# Altium footprint library KNR_Kurs.PcbLib: 250 footprints (part 12 of 16)
Each footprint in its own frame and in the unit in brackets; x right, y up, seen from the top. Pads: shape width x height; smd on the part's side, far side on the other; paste and mask are expansions set on the pad; w line width, h text height; cw(c..) or ccw(c..) is an arc to the next point about the centre after c.
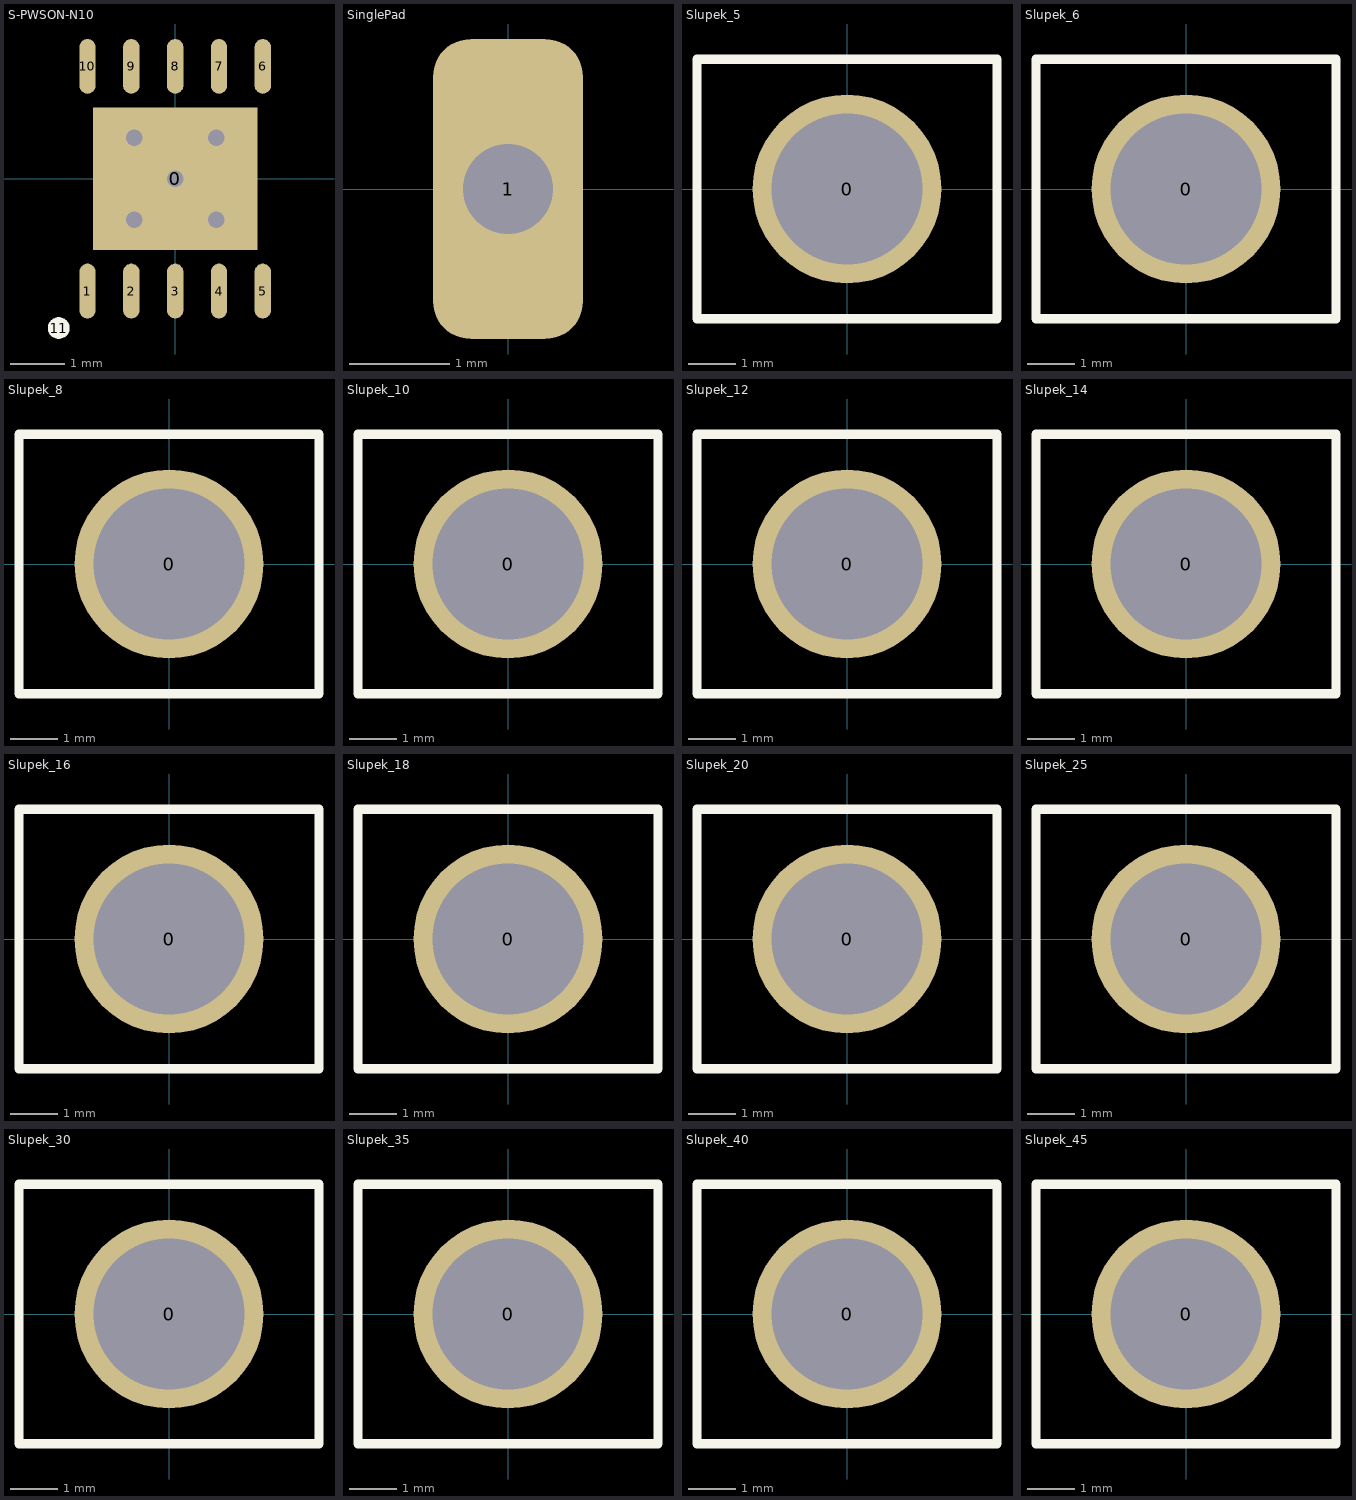
[diagram p11: the footprints below, top view; thin cyan lines are the x and y axes]

## S-PWSON-N10 [mm]
pads (12):
  rect 3x2.6 smd mask+0.07: 0(0,0)
  oval 0.3x1 smd mask+0.07: 1(-1.6,-2.05) 2(-0.8,-2.05) 3(0,-2.05) 4(0.8,-2.05) 5(1.6,-2.05) 6(1.6,2.05) 7(0.8,2.05) 8(0,2.05) 9(-0.8,2.05) 10(-1.6,2.05)
  round 0.4 on Top Overlay mask+0.07: 11(-2.125,-2.725)
via 0,0 diameter 0.6 hole 0.3
via 0.75,0.75 diameter 0.6 hole 0.3
via -0.75,0.75 diameter 0.6 hole 0.3
via -0.75,-0.75 diameter 0.6 hole 0.3
via 0.75,-0.75 diameter 0.6 hole 0.3
3D body "User Library-WSON-10-1.step": height 0.8, standoff 0, extent -2,-2 2,2

## SinglePad [mm]
pads (1):
  rrect50% 1.5x3 hole 0.9 mask+0.07: 1(0,0)

## Slupek_5 [mm] "M3, 5.5mm width"
pads (1):
  round 4 hole 3.2: 0(0,0)
Top Overlay:
  lines w0.2: -3.175,-2.75 3.175,-2.75 3.175,2.75 -3.175,2.75 -3.175,-2.75
3D body "Slupek_5.stp": height 5, standoff 0, extent -3.175,-2.75 3.175,2.75

## Slupek_6 [mm] "M3, 5.5mm width"
pads (1):
  round 4 hole 3.2: 0(0,0)
Top Overlay:
  lines w0.2: -3.175,-2.75 -3.175,2.75 3.175,2.75 3.175,-2.75 -3.175,-2.75
3D body "Slupek_6.stp": height 6, standoff 0, extent -3.175,-2.75 3.175,2.75

## Slupek_8 [mm] "M3, 5.5mm width"
pads (1):
  round 4 hole 3.2: 0(0,0)
Top Overlay:
  lines w0.2: -3.175,-2.75 3.175,-2.75 3.175,2.75 -3.175,2.75 -3.175,-2.75
3D body "Slupek_8.stp": height 8, standoff 0, extent -3.175,-2.75 3.175,2.75

## Slupek_10 [mm] "M3, 5.5mm width"
pads (1):
  round 4 hole 3.2: 0(0,0)
Top Overlay:
  lines w0.2: -3.175,-2.75 3.175,-2.75 3.175,2.75 -3.175,2.75 -3.175,-2.75
3D body "Slupek_10.stp": height 10, standoff 0, extent -3.175,-2.75 3.175,2.75

## Slupek_12 [mm] "M3, 5.5mm width"
pads (1):
  round 4 hole 3.2: 0(0,0)
Top Overlay:
  lines w0.2: -3.175,-2.75 -3.175,2.75 3.175,2.75 3.175,-2.75 -3.175,-2.75
3D body "Slupek_12.stp": height 12, standoff 0, extent -3.175,-2.75 3.175,2.75

## Slupek_14 [mm] "M3, 5.5mm width"
pads (1):
  round 4 hole 3.2: 0(0,0)
Top Overlay:
  lines w0.2: -3.175,-2.75 3.175,-2.75 3.175,2.75 -3.175,2.75 -3.175,-2.75
3D body "Slupek_14.stp": height 14, standoff 0, extent -3.175,-2.75 3.175,2.75

## Slupek_16 [mm] "M3, 5.5mm width"
pads (1):
  round 4 hole 3.2: 0(0,0)
Top Overlay:
  lines w0.2: -3.175,-2.75 -3.175,2.75 3.175,2.75 3.175,-2.75 -3.175,-2.75
3D body "Slupek_16.stp": height 16, standoff 0, extent -3.175,-2.75 3.175,2.75

## Slupek_18 [mm] "M3, 5.5mm width"
pads (1):
  round 4 hole 3.2: 0(0,0)
Top Overlay:
  lines w0.2: -3.175,-2.75 3.175,-2.75 3.175,2.75 -3.175,2.75 -3.175,-2.75
3D body "Slupek_18.stp": height 18, standoff 0, extent -3.175,-2.75 3.176,2.75

## Slupek_20 [mm] "M3, 5.5mm width"
pads (1):
  round 4 hole 3.2: 0(0,0)
Top Overlay:
  lines w0.2: -3.175,-2.75 3.175,-2.75 3.175,2.75 -3.175,2.75 -3.175,-2.75
3D body "Slupek_20.stp": height 20, standoff 0, extent -3.175,-2.75 3.175,2.75

## Slupek_25 [mm] "M3, 5.5mm width"
pads (1):
  round 4 hole 3.2: 0(0,0)
Top Overlay:
  lines w0.2: -3.175,-2.75 3.175,-2.75 3.175,2.75 -3.175,2.75 -3.175,-2.75
3D body "Slupek_25.stp": height 25, standoff 0, extent -3.175,-2.75 3.175,2.75

## Slupek_30 [mm] "M3, 5.5mm width"
pads (1):
  round 4 hole 3.2: 0(0,0)
Top Overlay:
  lines w0.2: -3.175,-2.75 -3.175,2.75 3.175,2.75 3.175,-2.75 -3.175,-2.75
3D body "Slupek_30.stp": height 30, standoff 0, extent -3.175,-2.75 3.175,2.75

## Slupek_35 [mm] "M3, 5.5mm width"
pads (1):
  round 4 hole 3.2: 0(0,0)
Top Overlay:
  lines w0.2: -3.175,-2.75 3.175,-2.75 3.175,2.75 -3.175,2.75 -3.175,-2.75
3D body "Slupek_35.stp": height 35, standoff 0, extent -3.175,-2.75 3.175,2.75

## Slupek_40 [mm] "M3, 5.5mm width"
pads (1):
  round 4 hole 3.2: 0(0,0)
Top Overlay:
  lines w0.2: -3.175,-2.75 3.175,-2.75 3.175,2.75 -3.175,2.75 -3.175,-2.75
3D body "Slupek_40.stp": height 40, standoff 0, extent -3.175,-2.75 3.175,2.75

## Slupek_45 [mm] "M3, 5.5mm width"
pads (1):
  round 4 hole 3.2: 0(0,0)
Top Overlay:
  lines w0.2: -3.175,-2.75 3.175,-2.75 3.175,2.75 -3.175,2.75 -3.175,-2.75
3D body "Slupek_45.stp": height 45, standoff 0, extent -3.175,-2.75 3.176,2.75